# Altium footprint library PCB_MPPT.PcbLib: 48 footprints (part 2 of 3)
Each footprint in its own frame and in the unit in brackets; x right, y up, seen from the top. Pads: shape width x height; smd on the part's side, far side on the other; paste and mask are expansions set on the pad; w line width, h text height; cw(c..) or ccw(c..) is an arc to the next point about the centre after c.
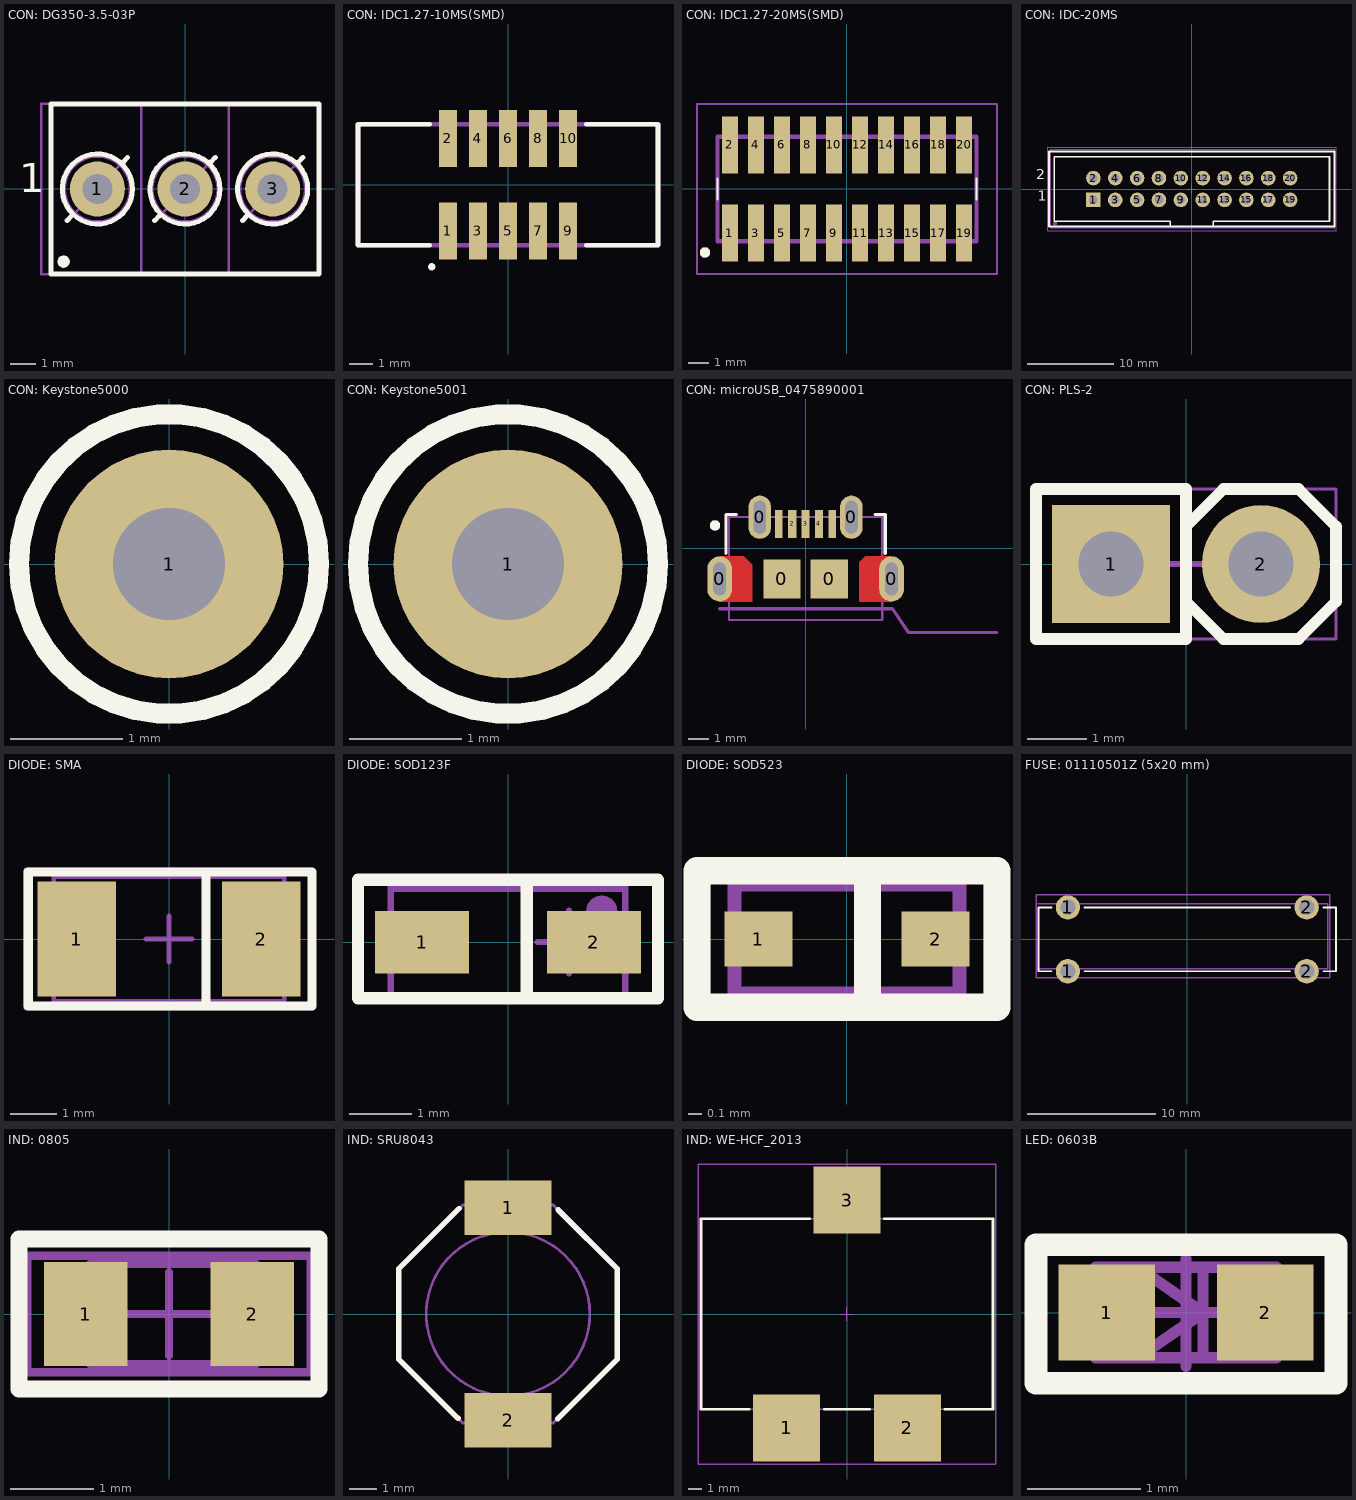
[diagram p1: the footprints below, top view; thin cyan lines are the x and y axes]

## CON: DG350-3.5-03P [mm]
pads (4):
  round 2.2 hole 1.2: 1(-3.5,0) 2(0,0) 3(3.5,0)
  round 0.5 on Top Overlay: ""(-4.85,-2.9)
Top Overlay:
  circle w0.2: c-3.5,0 r1.4
  circle w0.2: c0,0 r1.4
  circle w0.2: c3.5,0 r1.4
  lines w0.2: -4.709,-1.266 -4.526,-1.074 ; -2.474,1.074 -2.291,1.266 ; -1.209,-1.266 -1.026,-1.074 ; 1.026,1.074 1.209,1.266 ; 2.291,-1.266 2.474,-1.074 ; 4.526,1.074 4.709,1.266 ; -5.35,-3.4 -5.35,3.4 5.35,3.4 5.35,-3.4 -5.35,-3.4
  text "1" at -6.629,-0.533 h2
Top Assy:
  circle w0.1: c3.5,0 r1.3
  circle w0.1: c0,0 r1.3
  circle w0.1: c-3.5,0 r1.3
  lines w0.1: -4.382,-0.931 -2.618,0.931 ; -1.75,-3.4 -1.75,3.4 ; -0.882,-0.931 0.882,0.931 ; 1.75,-3.4 1.75,3.4 ; 2.618,-0.931 4.382,0.931 ; -5.75,-3.4 5.35,-3.4 5.35,3.4 -5.75,3.4 -5.75,-3.4
Mechanical 15:
  lines w0.1: -5.75,-3.4 5.35,-3.4 5.35,3.4 -5.75,3.4 -5.75,-3.4
3D body "444.STEP": height 8.4, standoff -3.5, extent -5.75,-3.4 5.75,3.4

## CON: IDC1.27-10MS(SMD) [mm] "3220-10-0300-00; SMD; CNC-tech"
pads (10):
  rect 0.76x2.4 smd: 1(-2.54,-1.95) 2(-2.54,1.95) 3(-1.27,-1.95) 4(-1.27,1.95) 5(0,-1.95) 6(0,1.95) 7(1.27,-1.95) 8(1.27,1.95) 9(2.54,-1.95) 10(2.54,1.95)
Top Overlay:
  circle w0.2: c-3.215,-3.463 r0.052
  lines w0.2: -3.3,-2.55 -6.325,-2.55 -6.325,2.55 -3.3,2.55 ; 3.3,-2.55 6.325,-2.55 6.325,2.55 3.3,2.55
3DBody:
  lines w0.2: -6.325,-2.55 6.325,-2.55 6.325,2.55 -6.325,2.55 -6.325,-2.55
3D body "User Library-3220-10-0300.STEP": height 5.4, standoff -0.2, extent -6.325,-2.75 6.325,2.75

## CON: IDC1.27-20MS(SMD) [mm] "3220-20-0300-00; SMD; CNC-tech"
pads (20):
  rect 0.76x2.8 smd: 1(-5.715,-2.15) 2(-5.715,2.15) 3(-4.445,-2.15) 4(-4.445,2.15) 5(-3.175,-2.15) 6(-3.175,2.15) 7(-1.905,-2.15) 8(-1.905,2.15) 9(-0.635,-2.15) 10(-0.635,2.15) 11(0.635,-2.15) 12(0.635,2.15) 13(1.905,-2.15) 14(1.905,2.15) 15(3.175,-2.15) 16(3.175,2.15) 17(4.445,-2.15) 18(4.445,2.15) 19(5.715,-2.15) 20(5.715,2.15)
Top Overlay:
  circle w0.25: c-6.94,-3.1 r0.125
  lines w0.1: -6.325,-0.5 -6.325,0.5 ; 6.325,-0.5 6.325,0.5
Top Assy:
  circle w0.25: c-6.94,-3.1 r0.125
  circle w0.25: c-6.94,-3.1 r0.125
  circle w0.25: c-6.94,-3.1 r0.125
3DBody:
  lines w0.2: -6.325,-2.55 -6.325,2.55 6.325,2.55 6.325,-2.55 -6.325,-2.55
Mechanical 15:
  lines w0.1: -7.325,-4.15 -7.325,4.15 7.325,4.15 7.325,-4.15 -7.325,-4.15
3D body "3220-20-0300-00.stp": height 5.9, standoff 0, extent -6.325,-3.074 6.325,3.074

## CON: IDC-20MS [mm]
height 10
pads (21):
  rect 1.7x1.7 hole 1: 1(-11.43,-1.27)
  round 1.7 hole 1: 2(-11.43,1.27) 3(-8.89,-1.27) 4(-8.89,1.27) 5(-6.35,-1.27) 6(-6.35,1.27) 7(-3.81,-1.27) 8(-3.81,1.27) 9(-1.27,-1.27) 10(-1.27,1.27) 11(1.27,-1.27) 12(1.27,1.27) 13(3.81,-1.27) 14(3.81,1.27) 15(6.35,-1.27) 16(6.35,1.27) 17(8.89,-1.27) 18(8.89,1.27) 19(11.43,-1.27) 20(11.43,1.27)
  round 0.5 on Mech1: 41(-15.9,-4)
Top Overlay:
  lines w0.2: -2.5,-4.35 -2.5,-3.75 -16,-3.75 -16,3.75 16,3.75 16,-3.75 2.5,-3.75 2.5,-4.35 ; -16.6,-4.35 16.6,-4.35 16.6,4.35 -16.6,4.35 -16.6,-4.35
  text "1" at -17.88,-1.795 h2
  text "2" at -18.105,0.755 h2
Top Assy:
  lines w0.1: -16.4,-4.5 16.6,-4.5 16.6,4.6 -16.4,4.6 -16.4,-4.5
Mechanical 15:
  lines w0.1: -0.5,0 0.5,0 ; 0,-0.5 0,0.5 ; -16.764,-4.826 -16.764,4.826 16.764,4.826 16.764,-4.826 -16.764,-4.826
3D body "IDC-20MS.STEP": height 9, standoff -3, extent -16.43,-4.52 16.57,4.58

## CON: Keystone5000 [mil] "For Keystone 500x miniature loop terminals"
height 181.1
pads (1):
  round 80 hole 39.37: 1(0,0)
Top Overlay:
  circle w7: c0,0 r52.5
Mechanical 5:
  circle w3.94: c0,0 r52.5
  text ".Designator" at -92.97,-15 h18
3D body "Keystone_5000.stp": height 181.97, standoff -118.11, extent -49,-49 49.04,49.24

## CON: Keystone5001 [mil] "For Keystone 500x miniature loop terminals"
height 181.1
pads (1):
  round 80 hole 39.37: 1(0,0)
Top Overlay:
  circle w7: c0,0 r52.5
Mechanical 5:
  circle w3.94: c0,0 r52.5
  text ".Designator" at -92.97,-15 h18
3D body "User Library-Test Point Keystone - 5001 BLACK.STEP": height 179.92, standoff -120.08, extent -49.99,-49.99 50.01,50.01

## CON: microUSB_0475890001 [mm] "MOLEX"
pads (11):
  oval 1.2x2.2 hole 0.6 slot 1.6 at 90 deg: 0(-4.175,-1.5) 0(4.175,-1.5)
  oval 1.1x2.1 hole 0.6 slot 1.6 at 90 deg: 0(-2.225,1.5) 0(2.225,1.5)
  rect 1.803x1.905 smd: 0(-1.15,-1.5) 0(1.15,-1.5)
  rect 0.35x1.35 smd: 1(-1.3,1.173) 5(1.3,1.173)
  rect 0.4x1.35 smd: 2(-0.65,1.173) 3(0,1.173) 4(0.65,1.173)
Top Layer:
  region: -4.175,-0.4 -3,-0.4 -2.6,-0.8 -2.6,-2.6 -4.175,-2.6 -3.875,-2.15 -3.872,-0.85
  region: 4.175,-0.4 2.9,-0.4 2.6,-0.7 2.6,-2.6 4.175,-2.6 3.875,-2.15 3.872,-0.85
Top Overlay:
  circle w0.25: c-4.4,1.1 r0.125
  lines w0.152: -3.873,-0.272 -3.873,1.627 -3.37,1.627 ; 3.37,1.627 3.874,1.627 3.874,-0.272
Top Assy:
  circle w0.25: c-4.4,1.1 r0.125
  lines w0.1: -3.725,-3.5 3.725,-3.5 3.725,1.5 -3.725,1.5 -3.725,-3.5
  lines w0.15: -4.175,-2.95 4.225,-2.95 5,-4.1 9.3,-4.1
  text "PCB edge" at 5.1,-3.8 h1.5
3D body "475890001_molexUSBm.stp": height 2.71, standoff -0.6, extent -4.325,-4.194 4.325,1.7

## CON: PLS-2 [mm]
height 10
pads (2):
  rect 2x2 hole 1.1: 1(-1.27,0)
  round 2 hole 1.1: 2(1.27,0)
Top Overlay:
  lines w0.2: 0,-0.635 0.635,-1.27 1.905,-1.27 2.54,-0.635 2.54,0.635 1.905,1.27 0.635,1.27 0,0.635 ; -2.54,-1.27 0,-1.27 0,1.27 -2.54,1.27 -2.54,-1.27
Top Assy:
  lines w0.1: 0,-0.635 0.635,-1.27 1.905,-1.27 2.54,-0.635 2.54,0.635 1.905,1.27 0.635,1.27 0,0.635 ; -2.54,-1.27 -2.54,1.27 0,1.27 0,-1.27 -2.54,-1.27
Mechanical 15:
  lines w0.05: -2.54,-1.27 -2.54,1.27 2.54,1.27 2.54,-1.27 -2.54,-1.27
  lines w0.1: -0.5,0 0.5,0 ; 0,-0.5 0,0.5
3D body "PLS-2.STEP": height 8.54, standoff -3, extent -2.573,-1.284 2.507,1.256

## DIODE: SMA [mm]
pads (3):
  rect 1.7x2.5 smd: 1(-2,0) 2(2,0)
  round 0.5 on Mech1: ""(2,0.9)
Top Overlay:
  lines w0.2: 0.8,-1.45 0.8,1.45 ; -3.05,-1.45 3.1,-1.45 3.1,1.45 -3.05,1.45 -3.05,-1.45
Top Assy:
  lines w0.1: -2.5,-1.35 2.5,-1.35 2.5,1.35 -2.5,1.35 -2.5,-1.35
Mechanical 15:
  lines w0.1: -0.5,0 0.5,0 ; 0,-0.5 0,0.5 ; -3.1,-1.5 -3.1,1.5 3.1,1.5 3.1,-1.5 -3.1,-1.5
3D body "User Library-Diode Molded BodyDIOM5025X231N.STEP": height 2.28, standoff -0.03, extent -2.5,-1.35 2.5,1.35

## DIODE: SOD123F [mm]
height 1
pads (3):
  rect 1.5x1 smd: 1(-1.375,0) 2(1.375,0)
  round 0.5 on Mech1: ""(1.5,0.5)
Top Overlay:
  lines w0.2: 0.3,-0.9 0.3,1 ; -2.4,-0.9 2.4,-0.9 2.4,1 2.3,1 -2.4,1 -2.4,-0.9
Top Assy:
  lines w0.1: -1.875,-0.85 -1.875,0.85 1.875,0.85 1.875,-0.85 -1.875,-0.85
Mechanical 15:
  lines w0.1: 0.475,0 1.475,0 ; 0.975,-0.5 0.975,0.5 ; -1.875,-0.9 -1.875,0.9 1.875,0.9 1.875,-0.9 -1.875,-0.9
3D body "SOD123F.STEP": height 1.23, standoff 0.02, extent -1.875,-0.85 1.875,0.85

## DIODE: SOD523 [mm]
pads (2):
  rect 0.5x0.4 smd: 1(-0.65,0) 2(0.65,0)
Top Overlay:
  lines w0.2: 0.15,-0.4 0.15,0.5 ; -1.1,-0.5 1.1,-0.5 1.1,0.5 -1.1,0.5 -1.1,-0.5
Top Assy:
  lines w0.1: 0.15,-0.4 0.15,0.4 ; -0.825,-0.4 -0.825,0.4 0.75,0.4 0.825,0.4 0.825,-0.4 -0.825,-0.4
Mechanical 15:
  lines w0.1: -1.05,-0.5 1.05,-0.5 1.05,0.5 -1.05,0.5 -1.05,-0.5
3D body "User Library-SOD523-2.STEP": height 0.65, standoff 0, extent -0.825,-0.4 0.825,0.4

## FUSE: 01110501Z (5x20 mm) [mm]
pads (4):
  round 1.9 hole 1.2: 1(-9.35,-2.5) 1(-9.35,2.5) 2(9.35,-2.5) 2(9.35,2.5)
Top Overlay:
  lines w0.15: -10.65,-2.5 -11.65,-2.5 -11.65,2.5 -10.65,2.5 ; -8.05,-2.5 8.05,-2.5 ; -8.05,2.5 8.05,2.5 ; 10.65,-2.5 11.65,-2.5 11.65,2.5 10.65,2.5
Top Assy:
  lines w0.1: -11.7,-2.3 11,-2.3 ; -11.7,2.8 11,2.8 ; 11,-2.3 11,-2.3 ; 11,-2.3 11,2.8 ; 11,2.8 11,2.8
Mechanical 15:
  lines w0.1: -11.85,-3 -11.85,3.5 11.15,3.5 11.15,-3 -11.85,-3
3D body "01110501Z.STEP": height 7.25, standoff -3.1, extent -11.7,-2.3 -6.9,2.8
3D body "01110501Z.STEP": height 7.25, standoff -3.1, extent 6.9,-2.35 11.7,2.75
3D body "User Library-FUSIVEL.STEP": height 8.5, standoff 3.5, extent -10.05,-2.2 9.95,2.8

## IND: 0805 [mm]
height 1
pads (2):
  rect 1x1.25 smd: 1(-1,0) 2(1,0)
Top Overlay:
  lines w0.2: -1.8,-0.9 1.8,-0.9 1.8,0.9 -1.8,0.9 -1.8,-0.9
Top Assy:
  lines w0.1: -0.949,-0.6 1.05,-0.6 1.05,0.6 -0.949,0.6 -0.949,-0.6
Mechanical 15:
  lines w0.1: -0.5,0 0.5,0 ; 0,-0.5 0,0.5 ; -1.7,-0.7 -1.7,0.7 1.7,0.7 1.7,-0.7 -1.7,-0.7
3D body "User Library-FB_2012-1.STEP": height 0.85, standoff 0, extent -1,-0.625 1,0.625

## IND: SRU8043 [mm] "bourns 8x8"
height 4.3
pads (2):
  rect 3.2x2 smd: 1(0,3.9) 2(0,-3.9)
Top Overlay:
  lines w0.2: -1.83,-3.83 -4,-1.66 -4,1.66 -1.792,3.868 ; 1.817,-3.842 4,-1.66 4,1.66 1.843,3.818
Top Assy:
  circle w0.1: c0,0 r3
  lines w0.1: -4,-1.66 -4,1.66 -1.66,4 1.66,4 4,1.66 4,-1.66 1.66,-4 -1.66,-4 -4,-1.66
3D body "sru8043.stp": height 4.1, standoff -0.2, extent -4,-4 4,4

## IND: WE-HCF_2013 [mm] "SMD High Current Inductor, body 21.8x14.2mm WURTH"
height 14.5
pads (3):
  rect 5x5 smd: 1(-4.5,-8.5) 2(4.5,-8.5) 3(0,8.5)
Top Overlay:
  lines w0.2: -7.3,-7.1 -10.9,-7.1 -10.9,7.1 -2.8,7.1 ; -1.7,-7.1 1.7,-7.1 ; 2.8,7.1 10.9,7.1 10.9,-7.1 7.3,-7.1
3DBody:
  lines w0.1: -5.75,-7.1 -5.75,-10.6 -3.25,-10.6 -3.25,-7.1 ; -1.25,7.1 -1.25,10.4 1.25,10.4 1.25,7.1 ; 3.25,-7.1 3.25,-10.6 5.75,-10.6 5.75,-7.1 ; -10.9,-7.1 -10.9,7.1 10.9,7.1 10.9,-7.1 -10.9,-7.1
Mechanical 15:
  lines w0.05: -0.5,0 0.5,0 ; 0,-0.5 0,0.5
  lines w0.1: -11.1,-11.2 -11.1,11.2 11.1,11.2 11.1,-11.2 -11.1,-11.2
3D body "STEP-WE-HCF-2013-rev1.stp": height 14.05, standoff 0.05, extent -10.75,-10.6 10.75,10.4

## LED: 0603B [mm]
height 0.45
pads (2):
  rect 0.85x0.85 smd: 1(-0.7,0) 2(0.7,0)
Top Overlay:
  lines w0.2: -1.325,-0.625 -1.325,0.6 1.325,0.6 1.325,-0.625 -1.325,-0.625
Top Assy:
  lines w0.025: -0.8,-0.4 -0.8,0.4 0.8,0.4 0.8,-0.4 -0.8,-0.4
  lines w0.1: 0.15,-0.4 0.15,0.4 ; -0.8,-0.4 -0.8,0.4 0.8,0.4 0.8,-0.4 -0.8,-0.4 ; -0.425,-0.4 0.15,0 -0.425,0.4 -0.425,-0.4
Mechanical 15:
  lines w0.1: -0.475,0 0.475,0 ; 0,-0.475 0,0.475 ; -1.325,-0.625 1.325,-0.625 1.325,0.6 -1.325,0.6 -1.325,-0.625
3D body "User Library-LED_0603_B.STEP": height 0.6, standoff 0, extent -0.8,-0.4 0.8,0.4